# Altium footprint library Components.PcbLib: 260 footprints (part 13 of 17)
Each footprint in its own frame and in the unit in brackets; x right, y up, seen from the top. Pads: shape width x height; smd on the part's side, far side on the other; paste and mask are expansions set on the pad; w line width, h text height; cw(c..) or ccw(c..) is an arc to the next point about the centre after c.
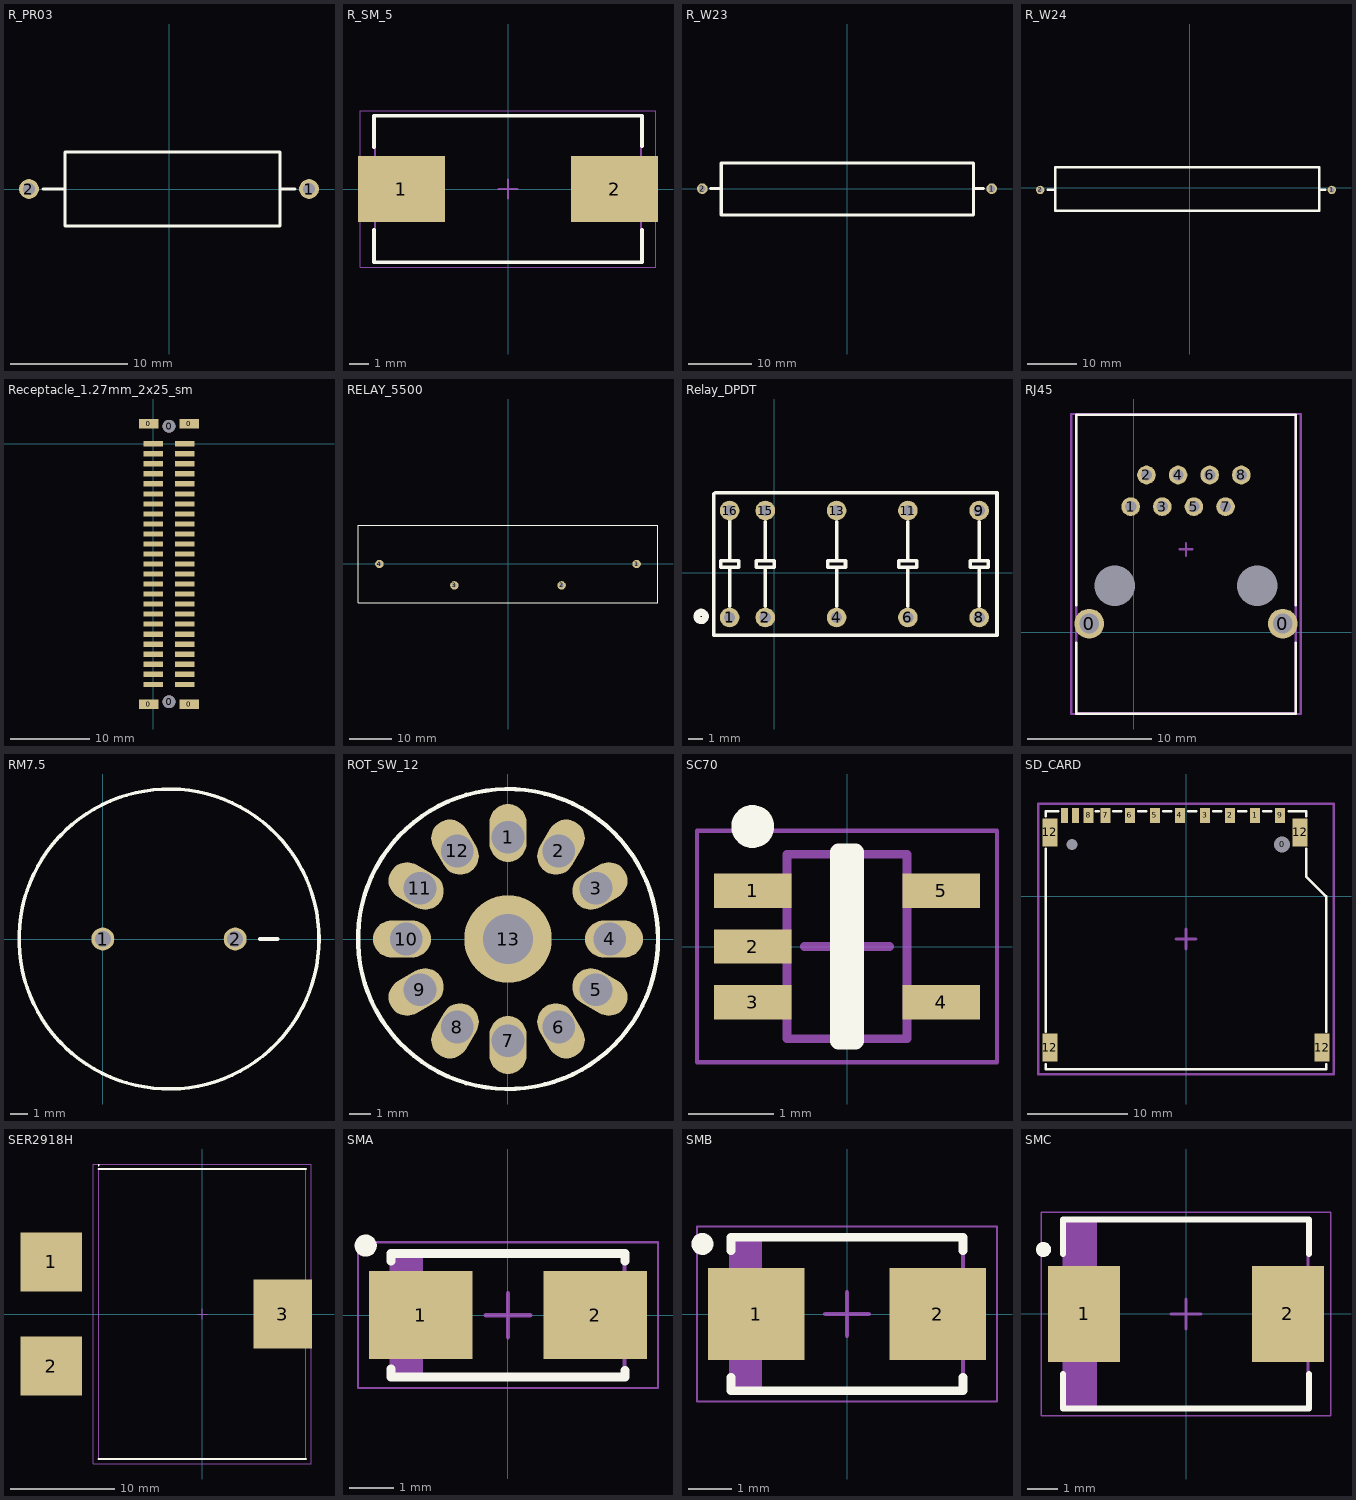
[diagram p12: the footprints below, top view; thin cyan lines are the x and y axes]

## R_PR03 [mm] "750V voltage rating resistor"
pads (2):
  round 1.7 hole 1: 1(12,0) 2(-12,0)
Top Overlay:
  lines w0.254: -10.795,0 -8.89,0 ; 9.525,0 10.795,0 ; -8.89,0 -8.89,3.175 9.525,3.175 9.525,-3.175 -8.89,-3.175 -8.89,0

## R_SM_5 [mm]
height 7.1
pads (2):
  rect 4.5x3.4 smd: 1(-5.525,0) 2(5.525,0)
Top Overlay:
  lines w0.2: -6.95,-2.125 -6.95,-3.8 6.95,-3.8 6.95,-2.125 ; -6.95,2.175 -6.95,3.8 6.95,3.8 6.95,2.225
Mechanical 13:
  lines w0.1: -6.9,-3.8 6.9,-3.8 6.9,3.8 -6.9,3.8 -6.9,-3.8
Mechanical 15:
  lines w0.05: -7.65,-4.05 7.65,-4.05 7.65,4.05 -7.65,4.05 -7.65,-4.05
  lines w0.1: -0.5,0 0.5,0 ; 0,-0.5 0,0.5
3D body: height 7.1, standoff 0, extent -6.9,-3.8 6.9,3.8

## R_W23 [mm]
pads (2):
  round 1.7 hole 1: 1(23,0) 2(-23,0)
Top Overlay:
  lines w0.5: -21.725,0 -20,0 ; 21.725,0 20.1,0 ; -20,0 -20,-4.2 20.1,-4.2 20.1,0 ; -20,0 -20,4.075 20.1,4.075 20.1,0

## R_W24 [mm] "Through hole resistor"
pads (2):
  round 1.7 hole 1: 1(28.775,-0.45) 2(-30.225,-0.45)
Top Overlay:
  lines w0.5: -28.65,-0.45 -27.225,-0.45 ; 27.475,-0.45 26.225,-0.45 ; -27.225,-0.45 -27.225,-4.65 26.225,-4.65 26.225,-0.45 ; -27.225,-0.45 -27.225,4.125 26.225,4.125 26.225,-0.45

## Receptacle_1.27mm_2x25_sm [mm]
pads (56):
  rect 2.5x1.2 smd: 0(-0.55,-32.99) 0(-0.55,2.51) 0(4.55,-32.99) 0(4.55,2.51)
  round 1.6 hole 1.6 unplated: 0(2,-32.69) 0(2,2.21)
  rect 2.5x0.65 smd: 1(0,0) 2(4,0) 3(0,-1.27) 4(4,-1.27) 5(0,-2.54) 6(4,-2.54) 7(0,-3.81) 8(4,-3.81) 9(0,-5.08) 10(4,-5.08) 11(0,-6.35) 12(4,-6.35) 13(0,-7.62) 14(4,-7.62) 15(0,-8.89) 16(4,-8.89) 17(0,-10.16) 18(4,-10.16) 19(0,-11.43) 20(4,-11.43) 21(0,-12.7) 22(4,-12.7) 23(0,-13.97) 24(4,-13.97) 25(0,-15.24) 26(4,-15.24) 27(0,-16.51) 28(4,-16.51) 29(0,-17.78) 30(4,-17.78) 31(0,-19.05) 32(4,-19.05) 33(0,-20.32) 34(4,-20.32) 35(0,-21.59) 36(4,-21.59) 37(0,-22.86) 38(4,-22.86) 39(0,-24.13) 40(4,-24.13) 41(0,-25.4) 42(4,-25.4) 43(0,-26.67) 44(4,-26.67) 45(0,-27.94) 46(4,-27.94) 47(0,-29.21) 48(4,-29.21) 49(0,-30.48) 50(4,-30.48)

## RELAY_5500 [mm]
pads (4):
  round 2 hole 1: 1(30.48,0) 2(12.7,-5.08) 3(-12.7,-5.08) 4(-30.48,0)
Top Overlay:
  lines w0.1: -35.56,-9.2 35.56,-9.2 35.56,9.2 -35.56,9.2 -35.56,-9.2
3D body "5500Relay.STEP": height 19.05, standoff -6.73, extent -35.56,-9.015 35.56,9.015

## Relay_DPDT [mm]
pads (10):
  round 1.4 hole 0.8: 1(-3.175,-3.175) 2(-0.635,-3.175) 4(4.445,-3.175) 6(9.525,-3.175) 8(14.605,-3.175) 9(14.605,4.445) 11(9.525,4.445) 13(4.445,4.445) 15(-0.635,4.445) 16(-3.175,4.445)
Top Overlay:
  circle w0.5: c-5.2,-3.1 r0.3
  lines w0.254: -4.318,5.635 -4.318,-4.445 15.875,-4.445 15.875,5.715 -4.191,5.715 ; -3.175,-2.375 -3.175,0.4 ; -3.175,0.87 -3.175,3.7 ; -0.635,-2.375 -0.635,0.4 ; -0.635,0.87 -0.635,3.645 ; 4.445,-2.375 4.445,0.4 ; 4.445,0.87 4.445,3.645 ; 9.525,-2.375 9.525,0.4 ; 9.525,0.87 9.525,3.645 ; 14.605,-2.375 14.605,0.4 ; 14.605,0.87 14.605,3.645 ; -3.175,0.4 -2.54,0.4 -2.54,0.87 -3.81,0.87 -3.81,0.4 -3.175,0.4 ; -0.635,0.4 0,0.4 0,0.87 -1.27,0.87 -1.27,0.4 -0.635,0.4 ; 4.445,0.4 5.08,0.4 5.08,0.87 3.81,0.87 3.81,0.4 4.445,0.4 ; 9.525,0.4 10.16,0.4 10.16,0.87 8.89,0.87 8.89,0.4 9.525,0.4 ; 14.605,0.4 15.24,0.4 15.24,0.87 13.97,0.87 13.97,0.4 14.605,0.4
3D body "Relay.stp": height 9.9, standoff -3.3, extent -4.31,-4.365 15.74,5.635

## RJ45 [mm]
pads (12):
  round 2.4 hole 1.6: 0(-3.575,0.677) 0(11.975,0.677)
  round 0 hole 3.25: 0(-1.515,3.732) 0(9.915,3.732)
  round 1.5 hole 0.9: 1(-0.245,10.082) 2(1.025,12.622) 3(2.295,10.082) 4(3.565,12.622) 5(4.835,10.082) 6(6.105,12.622) 7(7.375,10.082) 8(8.645,12.622)
Top Overlay:
  lines w0.2: -4.6,-0.85 -4.6,-6.55 13,-6.55 13,-0.85 ; -4.6,2.15 -4.6,17.45 13,17.45 13,2.15
Mechanical 13:
  lines w0.2: -4.6,-6.528 -4.6,17.472 13,17.472 13,-6.528 -4.6,-6.528
Mechanical 15:
  lines w0.2: 3.7,6.65 4.7,6.65 ; 4.2,6.15 4.2,7.15 ; -5,-6.578 13.4,-6.578 13.4,17.522 -5,17.522 -5,-6.578
3D body "RJ45-8P-Pipe-Cat5e.step": height 14.55, standoff -3.6, extent -4.6,-6.528 13,17.472

## RM7.5 [mm]
pads (2):
  round 1.3 hole 0.9: 1(0,0) 2(7.5,0)
Top Overlay:
  circle w0.2: c3.75,0 r8.5
  lines w0.2: 8.9,0 9.916,0
3D body "1000uF_capacitor.stp": height 26, standoff -3, extent -4.196,-7.899 11.696,7.949

## ROT_SW_12 [mm]
pads (13):
  oval 1.7x2.65 hole 1.5 copper offset 0,0.2 mask+0: 1(0,4.65)
  oval 1.7x2.65 hole 1.5 copper offset 0.1,0.173 rot 150 mask+0: 2(2.325,4.027)
  oval 1.7x2.65 hole 1.5 copper offset 0.173,0.1 rot 120 mask+0: 3(4.027,2.325)
  oval 2.65x1.7 hole 1.5 copper offset 0.2,0 mask+0: 4(4.65,0)
  oval 1.7x2.65 hole 1.5 copper offset 0.173,-0.1 rot 60 mask+0: 5(4.027,-2.325)
  oval 1.7x2.65 hole 1.5 copper offset 0.1,-0.173 rot 30 mask+0: 6(2.325,-4.027)
  oval 1.7x2.65 hole 1.5 copper offset 0,-0.2 mask+0: 7(0,-4.65)
  oval 1.7x2.65 hole 1.5 copper offset -0.1,-0.173 rot 150 mask+0: 8(-2.325,-4.027)
  oval 1.7x2.65 hole 1.5 copper offset -0.173,-0.1 rot 120 mask+0: 9(-4.027,-2.325)
  oval 2.65x1.7 hole 1.5 copper offset -0.2,0 mask+0: 10(-4.65,0)
  oval 1.7x2.65 hole 1.5 copper offset -0.173,0.1 rot 60 mask+0: 11(-4.027,2.325)
  oval 1.7x2.65 hole 1.5 copper offset -0.1,0.173 rot 30 mask+0: 12(-2.325,4.027)
  round 4 hole 2.3: 13(0,0)
Top Overlay:
  circle w0.2: c0,0 r6.859
3D body "rotary_switch_v4.stp": height 25.04, standoff -3.18, extent -6.3,-6.337 6.35,6.338

## SC70 [mm] "SOT23, 5-Leads, Body 2,00x2,30mm, Pitch 0,65mm, IPC Medium Density"
height 1.1
pads (5):
  rect 0.9x0.4 smd: 1(-1.1,0.65) 2(-1.1,0) 3(-1.1,-0.65) 4(1.1,-0.65) 5(1.1,0.65)
Top Overlay:
  circle w0.25: c-1.1,1.4 r0.125
  lines w0.2: -0.1,-1.1 -0.1,1.1 0.1,1.1 0.1,-1.1 -0.1,-1.1
Mechanical 13:
  lines w0.1: -0.7,-1.075 0.7,-1.075 0.7,1.075 -0.7,1.075 -0.7,-1.075
Mechanical 15:
  lines w0.05: -1.75,-1.35 1.75,-1.35 1.75,1.35 -1.75,1.35 -1.75,-1.35
  lines w0.1: -0.5,0 0.5,0 ; 0,-0.5 0,0.5
3D body: height 1.1, standoff 0.8, extent -0.7,-1.075 0.7,1.075

## SD_CARD [mm]
pads (17):
  round 0.025 hole 1.092 unplated: 0(-11.4,5.2)
  round 1.041 hole 1.6 unplated: 0(9.6,5.2)
  rect 1x1.5 smd: 1(6.9,8.1) 2(4.4,8.1) 3(1.9,8.1) 4(-0.6,8.1) 5(-3.1,8.1) 6(-5.6,8.1) 7(-8.025,8.1) 8(-9.725,8.1) 9(9.4,8.1)
  rect 0.7x1.5 smd: 10(-11.025,8.1) 11(-12.125,8.1)
  rect 1.5x2.794 smd: 12(-13.6,-15.1) 12(-13.6,6.4) 12(11.4,6.4) 12(13.6,-15.1)
Top Overlay:
  lines w0.254: -14,-16.75 -14,-17.25 14,-17.25 14,-16.75 ; -14,-13.5 -14,4.75 ; -14,8 -14,8.5 -12.75,8.5 ; -9,8.5 -8.75,8.5 ; -7.25,8.5 -6.5,8.5 ; -4.75,8.5 -4,8.5 ; -2.25,8.5 -1.5,8.5 ; 0.25,8.5 1,8.5 ; 2.75,8.5 3.5,8.5 ; 5.25,8.5 6,8.5 ; 7.75,8.5 8.5,8.5 ; 10.25,8.5 12,8.5 12,8 ; 12,4.75 12,2 14,0 14,-13.5
Mechanical 15:
  lines w0.254: -1,-4.25 1,-4.25 ; 0,-5.25 0,-3.25 ; -14.75,-17.75 -14.75,9.25 14.75,9.25 14.75,-17.75 -14.75,-17.75
3D body "SD_CARD.STEP": height 3.3, standoff -0.6, extent -13.988,-28.65 13.988,8.6

## SER2918H [mm]
height 17.78
pads (3):
  rect 5.9x5.65 smd: 1(-14.48,5) 2(-14.48,-5)
  rect 5.6x6.65 smd: 3(7.72,0)
Top Overlay:
  circle w0.1: c-9.95,14.3 r0.05
  lines w0.2: -9.95,-13.9 9.95,-13.9 ; -9.95,13.9 9.95,13.9
Mechanical 13:
  lines w0.1: -9.95,-13.9 9.95,-13.9 9.95,13.9 -9.95,13.9 -9.95,-13.9
Mechanical 15:
  lines w0.05: -10.45,-14.4 10.45,-14.4 10.45,14.4 -10.45,14.4 -10.45,-14.4
  lines w0.1: -0.5,0 0.5,0 ; 0,-0.5 0,0.5
3D body "SER2918.STEP": height 17.2, standoff 0, extent -16.858,-13.55 9.85,13.45

## SMA [mm]
height 2.3
pads (2):
  rect 2.35x2 smd: 1(-1.975,0) 2(1.975,0)
Top Overlay:
  circle w0.25: c-3.225,1.575 r0.125
  lines w0.2: -2.65,-1.225 -2.65,-1.4 2.65,-1.4 2.65,-1.25 ; -2.65,1.225 -2.65,1.4 2.65,1.4 2.65,1.225
Mechanical 13:
  rectangle: -2.64,-1.395 -1.93,1.395
  lines w0.1: -2.64,-1.395 2.64,-1.395 2.64,1.395 -2.64,1.395 -2.64,-1.395
Mechanical 15:
  lines w0.05: -3.4,-1.65 3.4,-1.65 3.4,1.65 -3.4,1.65 -3.4,-1.65
  lines w0.1: -0.5,0 0.5,0 ; 0,-0.5 0,0.5
3D body "SMA.step": height 2.6, standoff 0.03, extent -2.75,-1.4 2.75,1.4

## SMB [mm]
height 2.6
pads (2):
  rect 2.2x2.1 smd: 1(-2.075,0) 2(2.075,0)
Top Overlay:
  circle w0.25: c-3.3,1.6 r0.125
  lines w0.2: -2.65,-1.45 -2.65,-1.75 2.65,-1.75 2.65,-1.45 ; -2.65,1.45 -2.65,1.75 2.65,1.75 2.65,1.45
Mechanical 13:
  rectangle: -2.65,-1.74 -1.937,1.74
  lines w0.1: -2.65,-1.74 2.65,-1.74 2.65,1.74 -2.65,1.74 -2.65,-1.74
Mechanical 15:
  lines w0.05: -3.425,-2 3.425,-2 3.425,2 -3.425,2 -3.425,-2
  lines w0.1: -0.5,0 0.5,0 ; 0,-0.5 0,0.5
3D body "SMB.step": height 2.45, standoff 0.03, extent -2.75,-1.95 2.75,1.95

## SMC [mm]
height 2.6
pads (2):
  rect 2.4x3.2 smd: 1(-3.4,0) 2(3.4,0)
Top Overlay:
  circle w0.25: c-4.75,2.15 r0.125
  lines w0.2: -4.1,-2 -4.1,-3.15 4.1,-3.15 4.1,-2 ; -4.1,2 -4.1,3.15 4.1,3.15 4.1,2
Mechanical 13:
  rectangle: -4.065,-3.11 -2.972,3.11
  lines w0.1: -4.065,-3.11 4.065,-3.11 4.065,3.11 -4.065,3.11 -4.065,-3.11
Mechanical 15:
  lines w0.05: -4.825,-3.4 4.825,-3.4 4.825,3.4 -4.825,3.4 -4.825,-3.4
  lines w0.1: -0.5,0 0.5,0 ; 0,-0.5 0,0.5
3D body "SMC.step": height 2.4, standoff 0.03, extent -4.065,-3.05 4.065,3.05